# Altium footprint library RF Module.PcbLib: 12 footprints
Each footprint in its own frame and in the unit in brackets; x right, y up, seen from the top. Pads: shape width x height; smd on the part's side, far side on the other; paste and mask are expansions set on the pad; w line width, h text height; cw(c..) or ccw(c..) is an arc to the next point about the centre after c.
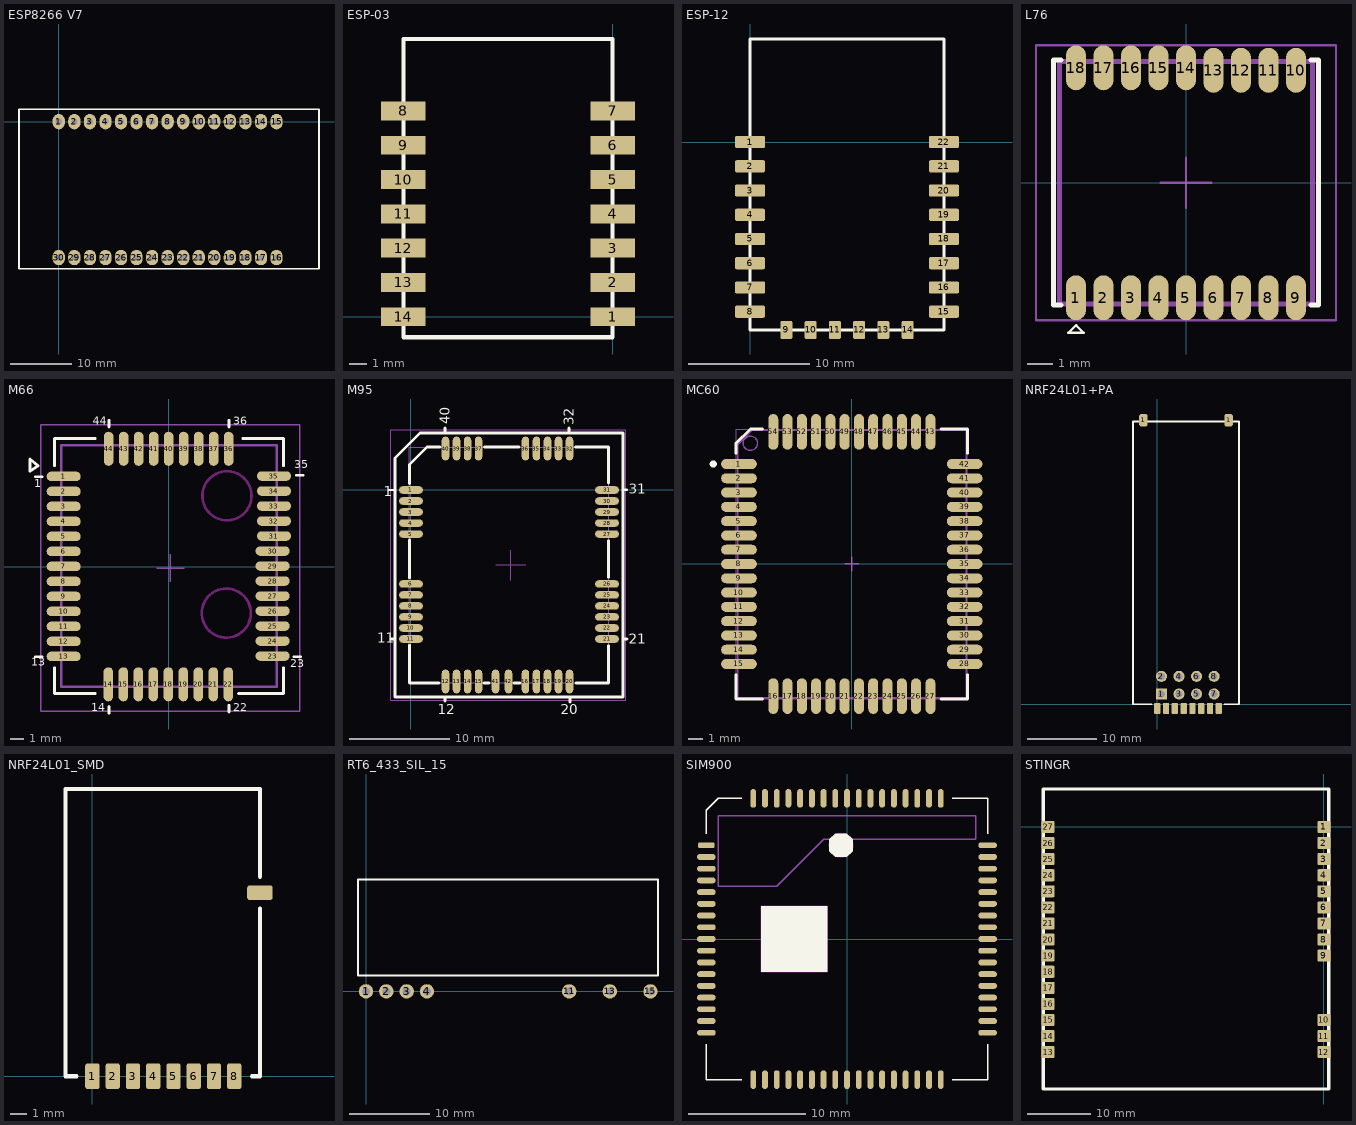
[diagram p0: the footprints below, top view; thin cyan lines are the x and y axes]

## ESP8266 V7 [mm]
pads (30):
  oval 2x2.5 hole 1 unplated: 1(0,0) 2(2.54,0) 3(5.08,0) 4(7.62,0) 5(10.16,0) 6(12.7,0) 7(15.24,0) 8(17.78,0) 9(20.32,0) 10(22.86,0) 11(25.4,0) 12(27.94,0) 13(30.48,0) 14(33.02,0) 15(35.56,0) 16(35.56,-22.2) 17(33.02,-22.2) 18(30.48,-22.2) 19(27.94,-22.2) 20(25.4,-22.2) 21(22.86,-22.2) 22(20.32,-22.2) 23(17.78,-22.2) 24(15.24,-22.2) 25(12.7,-22.2) 26(10.16,-22.2) 27(7.62,-22.2) 28(5.08,-22.2) 29(2.54,-22.2) 30(0,-22.2)
Top Overlay:
  lines w0.254: -6.5,-24 42.5,-24 42.5,2 -6.5,2 -6.5,-24
3D body "User Library-ESP8266 v7.STEP": height 7.75, standoff -6.34, extent -6.43,-23.735 42.39,1.815

## ESP-03 [mm] "ESP03"
pads (14):
  rect 2.6x1.1 smd: 1(0,0) 2(0,2) 3(0,4) 4(0,6) 5(0,8) 6(0,10) 7(0,12) 8(-12.2,12) 9(-12.2,10) 10(-12.2,8) 11(-12.2,6) 12(-12.2,4) 13(-12.2,2) 14(-12.2,0)
Top Overlay:
  lines w0.254: -12.2,-1.2 -12.2,16.2 0,16.2 0,-1.2 -12.2,-1.2
3D body "User Library-ESP-03.STEP": height 3.42, standoff -0.02, extent -12.3,-1.25 0,16.05

## ESP-12 [mm]
pads (22):
  rrect30% 2.5x1 smd: 1(0,0) 2(0,-2) 3(0,-4) 4(0,-6) 5(0,-8) 6(0,-10) 7(0,-12) 8(0,-14) 15(16,-14) 16(16,-12) 17(16,-10) 18(16,-8) 19(16,-6) 20(16,-4) 21(16,-2) 22(16,0)
  rrect30% 1x1.5 smd: 9(3,-15.5) 10(5,-15.5) 11(7,-15.5) 12(9,-15.5) 13(11,-15.5) 14(13,-15.5)
Top Overlay:
  lines w0.254: 0,-15.5 16,-15.5 16,8.5 0,8.5 0,-15.5
3D body "User Library-ESP-12E.step": height 2.65, standoff -0.04, extent -0.005,-15.505 16.005,8.5

## L76 [mm]
pads (18):
  oval 0.8x1.8 smd mask+0.15: 1(-4.4,-4.6) 2(-3.3,-4.6) 3(-2.2,-4.6) 4(-1.1,-4.6) 5(0,-4.6) 6(1.1,-4.6) 7(2.2,-4.6) 8(3.3,-4.6) 9(4.4,-4.6) 10(4.4,4.5) 11(3.3,4.5) 12(2.2,4.5) 13(1.1,4.5) 14(0,4.6) 15(-1.1,4.6) 16(-2.2,4.6) 17(-3.3,4.6) 18(-4.4,4.6)
Top Overlay:
  lines w0.1: -4.7,-6 -4.1,-6 -4.4,-5.7 -4.7,-6
  lines w0.2: -5,-4.9 -5.3,-4.9 -5.3,4.9 -5,4.9 ; 5,-4.9 5.3,-4.9 5.3,4.9 5,4.9
Mechanical 13:
  lines w0.2: -5.05,-4.85 -5.05,4.85 ; -5.05,-4.85 5.05,-4.85 5.05,4.85 -5.05,4.85
Mechanical 15:
  lines w0.1: -1,0 1,0 ; 0,-1 0,1 ; -6,-5.5 -6,5.5 6,5.5 6,-5.5 -6,-5.5
3D body "User Library-QUECTEL L76.step": height 2.52, standoff 0, extent -5.05,-4.85 5.05,4.85

## M66 [mm]
pads (44):
  oval 2.5x0.7 smd mask+0.15: 1(-7.712,6.612) 2(-7.712,5.512) 3(-7.712,4.412) 4(-7.712,3.312) 5(-7.712,2.213) 6(-7.712,1.112) 7(-7.712,0.012) 8(-7.712,-1.088) 9(-7.712,-2.188) 10(-7.712,-3.288) 11(-7.712,-4.388) 12(-7.712,-5.488) 13(-7.712,-6.588) 23(7.613,-6.563) 24(7.613,-5.463) 25(7.613,-4.363) 26(7.613,-3.263) 27(7.613,-2.163) 28(7.613,-1.063) 29(7.613,0.037) 30(7.613,1.137) 31(7.713,2.237) 32(7.713,3.337) 33(7.713,4.437) 34(7.713,5.537) 35(7.713,6.637)
  oval 0.7x2.5 smd mask+0.15: 14(-4.437,-8.637) 15(-3.337,-8.637) 16(-2.237,-8.637) 17(-1.137,-8.637) 18(-0.037,-8.637) 19(1.063,-8.637) 20(2.163,-8.637) 21(3.263,-8.637) 22(4.363,-8.637) 36(4.388,8.638) 37(3.288,8.638) 38(2.188,8.638) 39(1.088,8.638) 40(-0.012,8.638) 41(-1.112,8.638) 42(-2.212,8.638) 43(-3.312,8.638) 44(-4.412,8.638)
Top Layer keep-out:
  circle w0.2: c4.213,-3.413 r1.8
  circle w0.2: c4.263,5.188 r1.8
Top Overlay:
  lines w0.2: -9.787,-6.613 -9.287,-6.613 ; -9.787,6.588 -9.287,6.588 ; -8.387,-7.412 -8.387,-9.312 -5.387,-9.312 ; -8.387,7.388 -8.387,9.387 -5.387,9.387 ; -4.387,-10.762 -4.387,-10.262 ; -4.387,10.238 -4.387,10.737 ; 4.413,-10.662 4.413,-10.162 ; 4.413,10.238 4.413,10.737 ; 5.113,-9.312 8.413,-9.312 8.413,-7.412 ; 5.413,9.387 8.413,9.387 8.413,7.388 ; 9.163,-6.612 9.663,-6.612 ; 9.363,6.687 9.863,6.687 ; -10.187,6.988 -9.587,7.388 -10.187,7.888 -10.187,6.988
  text "1" at -9.887,5.587 h1
  text "13" at -10.087,-7.512 h1
  text "14" at -5.687,-10.813 h1
  text "22" at 4.713,-10.813 h1
  text "23" at 8.913,-7.612 h1
  text "35" at 9.213,6.988 h1
  text "36" at 4.713,10.188 h1
  text "44" at -5.587,10.188 h1
Mechanical 13:
  lines w0.2: -7.887,-8.812 7.913,-8.812 7.913,8.888 -7.887,8.888 -7.887,-8.812
Mechanical 15:
  lines w0.1: -0.887,-0.112 1.113,-0.112 ; 0.113,-1.112 0.113,0.888 ; -9.387,-10.612 -9.387,10.388 9.613,10.388 9.613,-10.6 9.1,-10.6 9.1,-10.612 -9.387,-10.612
3D body "User Library-m66_3d_150917_asm.STEP": height 2.3, standoff 0, extent -7.9,-8.85 7.9,8.85

## M95 [mm]
pads (42):
  oval 2.4x0.75 smd: 1(0,0) 2(0,-1.1) 3(0,-2.2) 4(0,-3.3) 5(0,-4.4) 6(0,-9.4) 7(0,-10.5) 8(0,-11.6) 9(0,-12.7) 10(0,-13.8) 11(0,-14.9) 21(19.6,-14.9) 22(19.6,-13.8) 23(19.6,-12.7) 24(19.6,-11.6) 25(19.6,-10.5) 26(19.6,-9.4) 27(19.6,-4.4) 28(19.6,-3.3) 29(19.6,-2.2) 30(19.6,-1.1) 31(19.6,0)
  oval 0.75x2.4 smd: 12(3.45,-19.15) 13(4.55,-19.15) 14(5.65,-19.15) 15(6.75,-19.15) 16(11.45,-19.15) 17(12.55,-19.15) 18(13.65,-19.15) 19(14.75,-19.15) 20(15.85,-19.15) 32(15.85,4.15) 33(14.75,4.15) 34(13.65,4.15) 35(12.55,4.15) 36(11.45,4.15) 37(6.75,4.15) 38(5.65,4.15) 39(4.55,4.15) 40(3.45,4.15) 41(8.45,-19.15) 42(9.75,-19.15)
Top Overlay:
  lines w0.25: -2.2,0 -1.65,0
  lines w0.254: -2,-14.9 -1.65,-14.9 ; -1.6,-20.4 -1.6,3.2 0.9,5.7 6.7,5.7 ; -1.6,-20.2 -1.6,-20.7 21.2,-20.7 21.2,5.7 6.5,5.7 ; -0.15,-15.525 -0.15,-19.3 2.8,-19.3 ; -0.15,-8.775 -0.15,-5 ; -0.15,0.65 -0.15,2.55 1.6,4.3 ; 1.625,4.3 2.9,4.3 ; 3.4,-21.1 3.4,-20.7 ; 3.4,5.8 3.4,6.2 ; 7.3,-19.3 7.8,-19.3 ; 7.35,4.3 10.8,4.3 ; 10.3,-19.3 10.9,-19.3 ; 15.8,5.8 15.8,6.2 ; 15.9,-21.2 15.9,-20.75 ; 16.45,4.3 19.75,4.3 19.75,0.7 ; 16.5,-19.3 19.75,-19.3 19.75,-15.575 ; 19.75,-8.725 19.75,-5.075 ; 21.272,0.036 21.572,0.036 ; 21.35,-14.9 21.6,-14.9
  text "20" at 15,-22.4 h1
  text "40" at 3.9,6.6 h1
  text "31" at 21.8,-0.4 h1
  text "32" at 16.3,6.5 h1
  text "21" at 21.8,-15.4 h1
  text "1" at -2.7,-0.6 h1
  text "11" at -3.4,-15.3 h1
  text "12" at 2.7,-22.4 h1
Mechanical 13:
  lines w0.1: -0.15,-19.3 19.75,-19.3 19.75,4.3 -0.15,4.3 -0.15,-19.3
Mechanical 15:
  lines w0.1: 8.5,-7.5 11.5,-7.5 ; 10,-9 10,-6 ; -2,-21 21.5,-21 21.5,6 -2,6 -2,-21
3D body "User Library-Quectel M95.step": height 2.66, standoff 0, extent -0.15,-19.3 19.75,4.3

## MC60 [mm] "LCC, 54-Pins, Body 16,00x18,70mmx2,10mm, Pitch 1,00mm, IPC Medium Density"
height 2.1
pads (54):
  oval 2.5x0.7 smd: 1(-7.9,7) 2(-7.9,6) 3(-7.9,5) 4(-7.9,4) 5(-7.9,3) 6(-7.9,2) 7(-7.9,1) 8(-7.9,0) 9(-7.9,-1) 10(-7.9,-2) 11(-7.9,-3) 12(-7.9,-4) 13(-7.9,-5) 14(-7.9,-6) 15(-7.9,-7) 28(7.9,-7) 29(7.9,-6) 30(7.9,-5) 31(7.9,-4) 32(7.9,-3) 33(7.9,-2) 34(7.9,-1) 35(7.9,0) 36(7.9,1) 37(7.9,2) 38(7.9,3) 39(7.9,4) 40(7.9,5) 41(7.9,6) 42(7.9,7)
  oval 0.7x2.5 smd: 16(-5.5,-9.25) 17(-4.5,-9.25) 18(-3.5,-9.25) 19(-2.5,-9.25) 20(-1.5,-9.25) 21(-0.5,-9.25) 22(0.5,-9.25) 23(1.5,-9.25) 24(2.5,-9.25) 25(3.5,-9.25) 26(4.5,-9.25) 27(5.5,-9.25) 43(5.5,9.25) 44(4.5,9.25) 45(3.5,9.25) 46(2.5,9.25) 47(1.5,9.25) 48(0.5,9.25) 49(-0.5,9.25) 50(-1.5,9.25) 51(-2.5,9.25) 52(-3.5,9.25) 53(-4.5,9.25) 54(-5.5,9.25)
Top Overlay:
  circle w0.25: c-9.7,7 r0.125
  lines w0.2: -8.1,-7.75 -8.1,-9.45 -6.25,-9.45 ; -8.1,7.75 -8.1,8.45 -7.1,9.45 -6.25,9.45 ; 6.25,-9.45 8.1,-9.45 8.1,-7.75 ; 6.25,9.45 8.1,9.45 8.1,7.75
Mechanical 11:
  text ".Designator" at -4.75,-0.75 h1.52
Mechanical 13:
  circle w0.1: c-7.1,8.45 r0.5
  lines w0.1: -8,-9.35 8,-9.35 8,9.35 -7,9.35 -8,8.35 -8,-9.35
  text ".Designator" at -4.75,-0.75 h1.52
Mechanical 15:
  lines w0.05: -8.075,-9.425 8.075,-9.425 8.075,9.425 -8.075,9.425 -8.075,-9.425
  lines w0.1: -0.5,0 0.5,0 ; 0,-0.5 0,0.5
3D body "User Library-Quectel MC60.step": height 2.1, standoff 0, extent -8.001,-9.351 8.001,9.351

## NRF24L01+PA [mm] "SMD RF module NRF24L01+ PA"
pads (18):
  rrect50% 1.2x1.8 smd: 1(-2,41) 1(10.3,41)
  rrect30% 0.9x1.6 smd: 1(0,-0.6) 2(1.27,-0.6) 3(2.54,-0.6) 4(3.81,-0.6) 5(5.08,-0.6) 6(6.35,-0.6) 7(7.62,-0.6) 8(8.89,-0.6)
  rect 1.6x1.6 hole 1: 1(0.6,1.5)
  round 1.6 hole 1: 2(0.6,4.04) 3(3.14,1.5) 4(3.14,4.04) 5(5.68,1.5) 6(5.68,4.04) 7(8.22,1.5) 8(8.22,4.04)
Top Overlay:
  lines w0.254: -0.8,0 -3.5,0 -3.5,40.8 11.8,40.8 11.8,0 9.7,0

## NRF24L01_SMD [mm] "SMD RF module NRF24L01+"
pads (9):
  rrect30% 0.9x1.6 smd: 1(0,0) 2(1.27,0) 3(2.54,0) 4(3.81,0) 5(5.08,0) 6(6.35,0) 7(7.62,0) 8(8.89,0)
  rrect30% 1.6x0.9 smd: ""(10.5,11.5)
Top Overlay:
  lines w0.254: -1,0 -1.7,0 -1.7,18 10.5,18 ; 10,0 10.5,0 10.5,10.5 ; 10.5,12.5 10.5,18 ; 10.5,18 10.5,18
3D body "User Library-4-11.step": height 0.8, standoff 0, extent -1.6,0 10.4,18

## RT6_433_SIL_15 [mm]
pads (7):
  round 1.8 hole 1: 1(0,0) 2(2.54,0) 3(5.08,0) 4(7.62,0) 11(25.4,0) 13(30.48,0) 15(35.56,0)
Top Overlay:
  lines w0.254: -1,2 36.5,2 36.5,14 -1,14 -1,2

## SIM900 [mm] "PCB for sim900"
height 3
pads (68):
  rrect50% 1.4x0.5 smd: 1(-12,8)
  oval 1.6x0.5 smd: 2(-12,7) 3(-12,6) 4(-12,5) 5(-12,4) 6(-12,3) 7(-12,2) 8(-12,1) 9(-12,0) 10(-12,-1) 11(-12,-2) 12(-12,-3) 13(-12,-4) 14(-12,-5) 15(-12,-6) 16(-12,-7) 17(-12,-8) 35(12,-8) 36(12,-7) 37(12,-6) 38(12,-5) 39(12,-4) 40(12,-3) 41(12,-2) 42(12,-1) 43(12,0) 44(12,1) 45(12,2) 46(12,3) 47(12,4) 48(12,5) 49(12,6) 50(12,7) 51(12,8)
  oval 0.5x1.6 smd: 18(-8,-12) 19(-7,-12) 20(-6,-12) 21(-5,-12) 22(-4,-12) 23(-3,-12) 24(-2,-12) 25(-1,-12) 26(0,-12) 27(1,-12) 28(2,-12) 29(3,-12) 30(4,-12) 31(5,-12) 32(6,-12) 33(7,-12) 34(8,-12) 52(8,12) 53(7,12) 54(6,12) 55(5,12) 56(4,12) 57(3,12) 58(2,12) 59(1,12) 60(0,12) 61(-1,12) 62(-2,12) 63(-3,12) 64(-4,12) 65(-5,12) 66(-6,12) 67(-7,12) 68(-8,12)
Top Overlay:
  region: -7.3,2.8 -1.7,2.8 -1.7,-2.8 -7.3,-2.8
  region: -1.5,8.5 -1,9 0,9 0.5,8.5 0.5,7.5 0,7 -1,7 -1.5,7.5
  lines w0.127: -12,-9 -12,-12 -9,-12 ; -12,9 -12,11 -11,12 -9,12 ; 9,-12 12,-12 12,-9 ; 9,12 12,12 12,9
Keep-Out Layer:
  circle w0.127: c-0.5,8 r1.005
  lines w0.127: -7.3,-2.8 -1.7,-2.8 -1.7,2.8 -7.3,2.8 -7.3,-2.8
Mechanical 13:
  lines w0.127: -11,4.5 -6,4.5 -2,8.5 11,8.5 11,10.5 -11,10.5 -11,4.5
3D body "SIM900.step": height 3.02, standoff 0, extent -12,-12 12,12

## STINGR [mil]
pads (27):
  rrect20% 80x75 smd: 1(0,0) 2(0,-100) 3(0,-200) 4(0,-300) 5(0,-400) 6(0,-500) 7(0,-600) 8(0,-700) 9(0,-800) 10(0,-1200) 11(0,-1300) 12(0,-1400) 13(-1714,-1400) 14(-1714,-1300) 15(-1714,-1200) 16(-1714,-1100) 17(-1714,-1000) 18(-1714,-900) 19(-1714,-800) 20(-1714,-700) 21(-1714,-600) 22(-1714,-500) 23(-1714,-400) 24(-1714,-300) 25(-1714,-200) 26(-1714,-100) 27(-1714,0)
Top Overlay:
  lines w19.68: -1744,-1629 -1744,236 30,236 30,-1629 -1744,-1629